# Altium footprint library PCB Modules.PcbLib: 23 footprints (part 1 of 2) (continued)
## PCBM_CERN_FEASTMP_V3_KIT [mm] "Full Kit of Radiation and Magnetic Field Tolerant 10W DC/DC Converter Module" (continued)
  text "1" at -14.247,3.196 h1
3D body "CERN_FEASTMP_V3_KIT_Part2.stp": height -1.6, standoff -4.4, extent -2.8,-3.175 2.778,3.176
3D body "CERN_FEASTMP_V3_KIT_Part1.stp": height 17.3, standoff -6.1, extent -21.57,-10.5 16,10.5

## PCBM_CERN_VTRX V2.1 (MM) [mm] "Versatile Transceiver Module VTRX V2.1 Multi-Mode Configuration (MM)"
height 10.24
pads (2):
  round 4.2 hole 3: 1(-25.74,0) 2(-12.74,0)
Top Overlay:
  circle w0.2: c-20.46,5.525 r0.4
  circle w0.2: c-20.46,-5.525 r0.4
  circle w0.2: c-20.46,-0.725 r0.4
  circle w0.2: c-20.46,0.725 r0.4
  lines w0.2: -46.5,-5.935 ccw(c-46.5,-5.535) -46.1,-5.535 ; -46.5,-0.465 cw(c-46.5,-0.865) -46.1,-0.865 -46.1,-5.539 ; -46.5,0.465 ccw(c-46.5,0.865) -46.1,0.852 -46.1,5.535 ccw(c-46.5,5.535) -46.5,5.935 ; -43.74,-5.435 -44.6,-5.435 -44.6,-5.935 -52.1,-5.935 -52.1,-0.465 -44.6,-0.465 -44.6,-0.965 -43.74,-0.965 ; -43.74,0.965 -44.6,0.965 -44.6,0.465 -52.1,0.465 -52.1,5.935 -44.6,5.935 -44.6,5.435 -43.74,5.435 ; -41,-0.925 -35.015,-0.925 ; -41,0.925 -35.015,0.925 ; -36.681,-5.45 cw(c-37.48,-5.42) -37.48,-6.22 -40.2,-6.22 cw(c-40.2,-5.42) -41,-5.42 -41,-4.525 -43.74,-4.525 -43.74,-7.25 -10.74,-7.25 -10.74,-6.05 ; -36.681,5.45 ccw(c-37.48,5.42) -37.48,6.22 -40.2,6.22 ccw(c-40.2,5.42) -41,5.42 -41,4.525 -43.74,4.525 -43.74,7.25 -10.74,7.25 -10.74,6.05 ; -35.38,-7.25 -35.38,-5.4 -37.321,-5.4 -37.321,-1.065 -35.015,-1.065 -35.015,1.065 -37.321,1.065 -37.321,5.4 -35.38,5.4 -35.38,7.25 ; -35.38,7.125 -28.43,7.125 -28.43,-7.125 ; -28.43,-6.42 -21.222,-6.42 ccw(c-21.222,-4.92) -20.44,-6.2 -10.74,-6.2 ; -28.43,-6.17 -24.97,-6.17 -24.97,-2.273 ; -28.43,-1.065 -29.13,-1.065 -29.13,-5.2 cw(c-29.93,-5.2) -29.93,-4.4 -29.93,-1.065 -31.68,-1.065 -31.68,1.065 -29.93,1.065 -29.93,4.4 cw(c-29.93,5.2) -29.13,5.2 -29.13,1.065 -28.43,1.065 ; -28.43,-0.23 -28.129,-0.23 ; -28.43,0.23 -28.129,0.23 ; -28.43,6.17 -24.97,6.17 -24.97,2.273 ; -28.43,6.42 -21.222,6.42 cw(c-21.222,4.92) -20.44,6.2 -10.74,6.2 ; -24.97,-5.7 -24.04,-5.7 ; -24.97,5.7 -24.04,5.7 ; -24.04,-1.694 -24.04,-5.995 -23.84,-5.995 -23.84,-1.466 ; -24.04,1.694 -24.04,5.995 -23.84,5.995 -23.84,1.466 ; -23.84,-5.45 -23.47,-5.45 ; -23.84,5.45 -23.47,5.45 ; -19.22,-6.2 cw(c-18.96,-6.35) -18.96,-6.05 -17.5,-6.05 cw(c-17.5,-6.35) -17.24,-6.2 ; -19.22,6.2 ccw(c-18.96,6.35) -18.96,6.05 -17.5,6.05 ccw(c-17.5,6.35) -17.24,6.2 ; -15.16,-6.2 cw(c-14.9,-6.35) -14.9,-6.05 -5.7,-6.05 -5.7,-4.9 cw(c-5.4,-4.9) -5.4,-4.6 -5.05,-4.6 ; -15.16,6.2 ccw(c-14.9,6.35) -14.9,6.05 -5.7,6.05 -5.7,4.9 ccw(c-5.4,4.9) -5.4,4.6 -5.05,4.6 ; -45.9,-4.35 -38.672,-4.35 -38.694,-2.05 -45.9,-2.05 -45.9,-4.35 ; -45.9,2.05 -38.672,2.05 -38.672,4.35 -45.9,4.35 -45.9,2.05 ; -43.74,-1.875 -41,-1.875 -41,-0.89 cw(c-40.6,-0.89) -40.6,-0.49 -38.894,-0.49 -38.894,0.49 -40.6,0.49 cw(c-40.6,0.89) -41,0.89 -41,1.875 -43.74,1.875 -43.74,-1.875 ; -23.47,-5.525 -20.96,-5.525 cw(c-20.46,-5.525) -19.96,-5.525 -18.17,-5.525 -18.17,-0.725 -19.96,-0.725 cw(c-20.46,-0.725) -20.96,-0.725 -23.47,-0.725 -23.47,-5.525 ; -23.47,0.725 -20.96,0.725 cw(c-20.46,0.725) -19.96,0.725 -18.17,0.725 -18.17,5.525 -19.96,5.525 cw(c-20.46,5.525) -20.96,5.525 -23.47,5.525 -23.47,0.725
Mechanical 8:
  lines w0.1: -26.24,0 -25.74,0 ; -25.74,-0.5 -25.74,0 ; -25.74,0.5 -25.74,0 ; -25.24,0 -25.74,0 ; -13.24,0 -12.74,0 ; -12.74,-0.5 -12.74,0 ; -12.74,0.5 -12.74,0 ; -12.24,0 -12.74,0 ; -0.5,0 0,0 ; 0,-0.5 0,0 ; 0,0.5 0,0 ; 0.5,0 0,0
Mechanical 14:
  drawing of 183 lines, arcs and shapes, not listed
3D body "PCBM_CERN_VTRX V2.1 (MM)_Part1.stp": height 7.9, standoff 1.3, extent -34.78,-6.85 1.8,6.85
3D body "PCBM_CERN_VTRX V2.1 (MM)_Part2.stp": height 10, standoff -1, extent -43.74,-7.25 -10.74,7.25
3D body "PCBM_CERN_VTRX V2.1 (MM)_Part3.stp": height 1.1, standoff -2.7, extent -27.639,-1.899 -10.841,1.899
3D body "PCBM_CERN_VTRX V2.1 (MM)_Part4.stp": height 11.71, standoff 1.87, extent -52.1,-5.935 -30.6,5.935

## PCBM_CERN_VTRX V2.1 (SM) [mm] "Versatile Transceiver Module VTRX V2.1 Single-Mode Configuration (SM)"
height 10.24
pads (2):
  round 4.2 hole 3: 1(-27.28,0) 2(-16.78,0)
Top Overlay:
  drawing of 706 lines, arcs and shapes, not listed
Mechanical 8:
  lines w0.1: -27.78,0 -27.28,0 ; -27.28,-0.5 -27.28,0 ; -27.28,0.5 -27.28,0 ; -26.78,0 -27.28,0 ; -17.28,0 -16.78,0 ; -16.78,-0.5 -16.78,0 ; -16.78,0.5 -16.78,0 ; -16.28,0 -16.78,0 ; -0.5,0 0,0 ; 0,-0.5 0,0 ; 0,0.5 0,0 ; 0.5,0 0,0
Mechanical 14:
  drawing of 760 lines, arcs and shapes, not listed
3D body "PCBM_CERN_VTRX V2.1 (SM)_Part3.stp": height 11.74, standoff 1.89, extent -56.14,-5.935 -34.64,5.935
3D body "PCBM_CERN_VTRX V2.1 (SM)_Part2.stp": height 1.1, standoff -2.7, extent -29.179,-1.899 -14.88,1.9
3D body "PCBM_CERN_VTRX V2.1 (SM)_Part1.stp": height 10.03, standoff -0.97, extent -47.78,-7.25 1.8,7.25

## PCBM_CERN_VTRx-V1.0 [mm] "Versatile Transmitter Module"
height 9.88
Top Overlay:
  drawing of 158 lines, arcs and shapes, not listed
Mechanical 8:
  lines w0.1: -0.5,0 0,0 ; 0,-0.5 0,0 ; 0,0.5 0,0 ; 0.5,0 0,0
Mechanical 14:
  drawing of 159 lines, arcs and shapes, not listed
3D body "PCBM_CERN_VTRx-V1.0.stp": height 11.74, standoff 0, extent -56.05,-7.225 0,7.225

## PCBM_CERN_VTRx-V2.0 [mm] "Versatile Transmitter Module"
height 10.24
pads (2):
  round 4.2 hole 3: 1(-27.54,0) 2(-14.54,0)
Top Overlay:
  circle w0.2: c-22.26,0.725 r0.4
  circle w0.2: c-22.26,-0.725 r0.4
  circle w0.2: c-22.26,-5.525 r0.4
  circle w0.2: c-22.26,5.525 r0.4
  lines w0.2: -48.3,-5.935 ccw(c-48.3,-5.535) -47.9,-5.535 ; -48.3,-0.465 cw(c-48.3,-0.865) -47.9,-0.865 -47.9,-5.539 ; -48.3,0.465 ccw(c-48.3,0.865) -47.9,0.852 -47.9,5.535 ccw(c-48.3,5.535) -48.3,5.935 ; -45.54,-5.435 -46.4,-5.435 -46.4,-5.935 -53.9,-5.935 -53.9,-0.465 -46.4,-0.465 -46.4,-0.965 -45.54,-0.965 ; -45.54,0.965 -46.4,0.965 -46.4,0.465 -53.9,0.465 -53.9,5.935 -46.4,5.935 -46.4,5.435 -45.54,5.435 ; -42.8,-0.925 -36.815,-0.925 ; -42.8,0.925 -36.815,0.925 ; -38.481,-5.45 cw(c-39.28,-5.42) -39.28,-6.22 -42,-6.22 cw(c-42,-5.42) -42.8,-5.42 -42.8,-4.525 -45.54,-4.525 -45.54,-7.25 -12.54,-7.25 -12.54,-6.05 ; -38.481,5.45 ccw(c-39.28,5.42) -39.28,6.22 -42,6.22 ccw(c-42,5.42) -42.8,5.42 -42.8,4.525 -45.54,4.525 -45.54,7.25 -12.54,7.25 -12.54,6.05 ; -37.18,-7.25 -37.18,-5.4 -39.121,-5.4 -39.121,-1.065 -36.815,-1.065 -36.815,1.065 -39.121,1.065 -39.121,5.4 -37.18,5.4 -37.18,7.25 ; -37.18,7.125 -30.23,7.125 -30.23,-7.125 ; -30.23,-6.42 -23.022,-6.42 ccw(c-23.022,-4.92) -22.24,-6.2 -12.54,-6.2 ; -30.23,-6.17 -26.77,-6.17 -26.77,-2.273 ; -30.23,-1.065 -30.93,-1.065 -30.93,-5.2 cw(c-31.73,-5.2) -31.73,-4.4 -31.73,-1.065 -33.48,-1.065 -33.48,1.065 -31.73,1.065 -31.73,4.4 cw(c-31.73,5.2) -30.93,5.2 -30.93,1.065 -30.23,1.065 ; -30.23,-0.23 -29.929,-0.23 ; -30.23,0.23 -29.929,0.23 ; -30.23,6.17 -26.77,6.17 -26.77,2.273 ; -30.23,6.42 -23.022,6.42 cw(c-23.022,4.92) -22.24,6.2 -12.54,6.2 ; -26.77,-5.7 -25.84,-5.7 ; -26.77,5.7 -25.84,5.7 ; -25.84,-1.694 -25.84,-5.995 -25.64,-5.995 -25.64,-1.466 ; -25.84,1.694 -25.84,5.995 -25.64,5.995 -25.64,1.466 ; -25.64,-5.45 -25.27,-5.45 ; -25.64,5.45 -25.27,5.45 ; -21.02,-6.2 cw(c-20.76,-6.35) -20.76,-6.05 -19.3,-6.05 cw(c-19.3,-6.35) -19.04,-6.2 ; -21.02,6.2 ccw(c-20.76,6.35) -20.76,6.05 -19.3,6.05 ccw(c-19.3,6.35) -19.04,6.2 ; -16.96,-6.2 cw(c-16.7,-6.35) -16.7,-6.05 -7.5,-6.05 -7.5,-4.9 cw(c-7.2,-4.9) -7.2,-4.6 -6.85,-4.6 ; -16.96,6.2 ccw(c-16.7,6.35) -16.7,6.05 -7.5,6.05 -7.5,4.9 ccw(c-7.2,4.9) -7.2,4.6 -6.85,4.6 ; -47.7,-4.35 -47.7,-2.05 -40.494,-2.05 -40.472,-4.35 -47.7,-4.35 ; -47.7,2.05 -47.7,4.35 -40.472,4.35 -40.472,2.05 -47.7,2.05 ; -45.54,-1.875 -45.54,1.875 -42.8,1.875 -42.8,0.89 ccw(c-42.4,0.89) -42.4,0.49 -40.694,0.49 -40.694,-0.49 -42.4,-0.49 ccw(c-42.4,-0.89) -42.8,-0.89 -42.8,-1.875 -45.54,-1.875 ; -25.27,-5.525 -25.27,-0.725 -22.76,-0.725 ccw(c-22.26,-0.725) -21.76,-0.725 -19.97,-0.725 -19.97,-5.525 -21.76,-5.525 ccw(c-22.26,-5.525) -22.76,-5.525 -25.27,-5.525 ; -25.27,0.725 -25.27,5.525 -22.76,5.525 ccw(c-22.26,5.525) -21.76,5.525 -19.97,5.525 -19.97,0.725 -21.76,0.725 ccw(c-22.26,0.725) -22.76,0.725 -25.27,0.725
Mechanical 8:
  lines w0.1: -28.04,0 -27.54,0 ; -27.54,-0.5 -27.54,0 ; -27.54,0.5 -27.54,0 ; -27.04,0 -27.54,0 ; -15.04,0 -14.54,0 ; -14.54,-0.5 -14.54,0 ; -14.54,0.5 -14.54,0 ; -14.04,0 -14.54,0 ; -0.5,0 0,0 ; 0,-0.5 0,0 ; 0,0.5 0,0 ; 0.5,0 0,0
Mechanical 14:
  drawing of 183 lines, arcs and shapes, not listed
3D body "PCBM_CERN_VTRx-V2.0_Part1.stp": height 11.71, standoff -1, extent -53.9,-7.25 0,7.25
3D body "PCBM_CERN_VTRx-V2.0_Part2.stp": height 1.1, standoff -2.7, extent -29.439,-1.899 -12.64,1.9

## PCBM_CERN_VTTx V2.1 [mm] "Versatile Twin Transmitter Module"
height 10.24
pads (2):
  round 4.2 hole 3: 1(-25.74,0) 2(-12.74,0)
Top Overlay:
  circle w0.2: c-20.46,5.525 r0.4
  circle w0.2: c-20.46,-5.525 r0.4
  circle w0.2: c-20.46,-0.725 r0.4
  circle w0.2: c-20.46,0.725 r0.4
  lines w0.2: -46.5,-5.935 ccw(c-46.5,-5.535) -46.1,-5.535 ; -46.5,-0.465 cw(c-46.5,-0.865) -46.1,-0.865 -46.1,-5.539 ; -46.5,0.465 ccw(c-46.5,0.865) -46.1,0.853 -46.1,5.535 ccw(c-46.5,5.535) -46.5,5.935 ; -43.74,-5.435 -44.6,-5.435 -44.6,-5.935 -52.1,-5.935 -52.1,-0.465 -44.6,-0.465 -44.6,-0.965 -43.74,-0.965 ; -43.74,0.965 -44.6,0.965 -44.6,0.465 -52.1,0.465 -52.1,5.935 -44.6,5.935 -44.6,5.435 -43.74,5.435 ; -41,-0.925 -35.015,-0.925 ; -41,0.925 -35.015,0.925 ; -36.681,-5.45 cw(c-37.48,-5.42) -37.48,-6.22 -40.2,-6.22 cw(c-40.2,-5.42) -41,-5.42 -41,-4.525 -43.74,-4.525 -43.74,-7.25 -10.74,-7.25 -10.74,-6.05 ; -36.681,5.45 ccw(c-37.48,5.42) -37.48,6.22 -40.2,6.22 ccw(c-40.2,5.42) -41,5.42 -41,4.525 -43.74,4.525 -43.74,7.25 -10.74,7.25 -10.74,6.05 ; -35.38,-7.25 -35.38,-5.4 -37.321,-5.4 -37.321,-1.065 -35.015,-1.065 -35.015,1.065 -37.321,1.065 -37.321,5.4 -35.38,5.4 -35.38,7.25 ; -35.38,7.125 -28.43,7.125 -28.43,-7.125 ; -28.43,-6.42 -21.222,-6.42 ccw(c-21.222,-4.92) -20.44,-6.2 -10.74,-6.2 ; -28.43,-6.17 -24.97,-6.17 -24.97,-2.273 ; -28.43,-1.065 -29.13,-1.065 -29.13,-5.2 cw(c-29.93,-5.2) -29.93,-4.4 -29.93,-1.065 -31.68,-1.065 -31.68,1.065 -29.93,1.065 -29.93,4.4 cw(c-29.93,5.2) -29.13,5.2 -29.13,1.065 -28.43,1.065 ; -28.43,-0.23 -28.129,-0.23 ; -28.43,0.23 -28.129,0.23 ; -28.43,6.17 -24.97,6.17 -24.97,2.273 ; -28.43,6.42 -21.222,6.42 cw(c-21.222,4.92) -20.44,6.2 -10.74,6.2 ; -24.97,-5.7 -24.04,-5.7 ; -24.97,5.7 -24.04,5.7 ; -24.04,-1.694 -24.04,-5.995 -23.84,-5.995 -23.84,-1.466 ; -24.04,1.694 -24.04,5.995 -23.84,5.995 -23.84,1.466 ; -23.84,-5.45 -23.47,-5.45 ; -23.84,5.45 -23.47,5.45 ; -19.22,-6.2 cw(c-18.96,-6.35) -18.96,-6.05 -17.5,-6.05 cw(c-17.5,-6.35) -17.24,-6.2 ; -19.22,6.2 ccw(c-18.96,6.35) -18.96,6.05 -17.5,6.05 ccw(c-17.5,6.35) -17.24,6.2 ; -15.16,-6.2 cw(c-14.9,-6.35) -14.9,-6.05 -5.7,-6.05 -5.7,-4.9 cw(c-5.4,-4.9) -5.4,-4.6 -5.05,-4.6 ; -15.16,6.2 ccw(c-14.9,6.35) -14.9,6.05 -5.7,6.05 -5.7,4.9 ccw(c-5.4,4.9) -5.4,4.6 -5.05,4.6 ; -45.9,-4.35 -38.672,-4.35 -38.694,-2.05 -45.9,-2.05 -45.9,-4.35 ; -45.9,2.05 -38.672,2.05 -38.672,4.35 -45.9,4.35 -45.9,2.05 ; -43.74,-1.875 -41,-1.875 -41,-0.89 cw(c-40.6,-0.89) -40.6,-0.49 -38.894,-0.49 -38.894,0.49 -40.6,0.49 cw(c-40.6,0.89) -41,0.89 -41,1.875 -43.74,1.875 -43.74,-1.875 ; -23.47,-5.525 -20.96,-5.525 cw(c-20.46,-5.525) -19.96,-5.525 -18.17,-5.525 -18.17,-0.725 -19.96,-0.725 cw(c-20.46,-0.725) -20.96,-0.725 -23.47,-0.725 -23.47,-5.525 ; -23.47,0.725 -20.96,0.725 cw(c-20.46,0.725) -19.96,0.725 -18.17,0.725 -18.17,5.525 -19.96,5.525 cw(c-20.46,5.525) -20.96,5.525 -23.47,5.525 -23.47,0.725
Mechanical 8:
  lines w0.1: -26.24,0 -25.74,0 ; -25.74,-0.5 -25.74,0 ; -25.74,0.5 -25.74,0 ; -25.24,0 -25.74,0 ; -13.24,0 -12.74,0 ; -12.74,-0.5 -12.74,0 ; -12.74,0.5 -12.74,0 ; -12.24,0 -12.74,0 ; -0.5,0 0,0 ; 0,-0.5 0,0 ; 0,0.5 0,0 ; 0.5,0 0,0
Mechanical 14:
  drawing of 183 lines, arcs and shapes, not listed
3D body "PCBM_CERN_VTTX V2_Part1.stp": height 7.9, standoff 1.3, extent -34.78,-6.85 1.8,6.85
3D body "PCBM_CERN_VTTX V2_Part2.stp": height 10, standoff -1, extent -43.74,-7.25 -10.74,7.25
3D body "PCBM_CERN_VTTX V2_Part3.stp": height 1.1, standoff -2.7, extent -27.639,-1.899 -10.84,1.9
3D body "PCBM_CERN_VTTX V2_Part4.stp": height 11.71, standoff 1.87, extent -52.1,-5.935 -30.6,5.935

## PCBM_CERN_VTTx-V1.0 [mm] "Versatile Twin Transmitter Module"
height 9.88
Top Overlay:
  drawing of 158 lines, arcs and shapes, not listed
Mechanical 8:
  lines w0.1: -0.5,0 0,0 ; 0,-0.5 0,0 ; 0,0.5 0,0 ; 0.5,0 0,0
Mechanical 14:
  drawing of 159 lines, arcs and shapes, not listed
3D body "PCBM_CERN_VTTx-V1.0.stp": height 11.74, standoff 0, extent -56.05,-7.225 0,7.225

## PCBM_CERN_VTTx-V2.0 [mm] "Versatile Twin Transmitter Module"
height 10.24
pads (2):
  round 4.2 hole 3: 1(-25.74,0) 2(-12.74,0)
Top Overlay:
  circle w0.2: c-20.46,0.725 r0.4
  circle w0.2: c-20.46,-0.725 r0.4
  circle w0.2: c-20.46,-5.525 r0.4
  circle w0.2: c-20.46,5.525 r0.4
  lines w0.2: -46.5,-5.935 ccw(c-46.5,-5.535) -46.1,-5.535 ; -46.5,-0.465 cw(c-46.5,-0.865) -46.1,-0.865 -46.1,-5.539 ; -46.5,0.465 ccw(c-46.5,0.865) -46.1,0.853 -46.1,5.535 ccw(c-46.5,5.535) -46.5,5.935 ; -43.74,-5.435 -44.6,-5.435 -44.6,-5.935 -52.1,-5.935 -52.1,-0.465 -44.6,-0.465 -44.6,-0.965 -43.74,-0.965 ; -43.74,0.965 -44.6,0.965 -44.6,0.465 -52.1,0.465 -52.1,5.935 -44.6,5.935 -44.6,5.435 -43.74,5.435 ; -41,-0.925 -35.015,-0.925 ; -41,0.925 -35.015,0.925 ; -36.681,-5.45 cw(c-37.48,-5.42) -37.48,-6.22 -40.2,-6.22 cw(c-40.2,-5.42) -41,-5.42 -41,-4.525 -43.74,-4.525 -43.74,-7.25 -10.74,-7.25 -10.74,-6.05 ; -36.681,5.45 ccw(c-37.48,5.42) -37.48,6.22 -40.2,6.22 ccw(c-40.2,5.42) -41,5.42 -41,4.525 -43.74,4.525 -43.74,7.25 -10.74,7.25 -10.74,6.05 ; -35.38,-7.25 -35.38,-5.4 -37.321,-5.4 -37.321,-1.065 -35.015,-1.065 -35.015,1.065 -37.321,1.065 -37.321,5.4 -35.38,5.4 -35.38,7.25 ; -35.38,7.125 -28.43,7.125 -28.43,-7.125 ; -28.43,-6.42 -21.222,-6.42 ccw(c-21.222,-4.92) -20.44,-6.2 -10.74,-6.2 ; -28.43,-6.17 -24.97,-6.17 -24.97,-2.273 ; -28.43,-1.065 -29.13,-1.065 -29.13,-5.2 cw(c-29.93,-5.2) -29.93,-4.4 -29.93,-1.065 -31.68,-1.065 -31.68,1.065 -29.93,1.065 -29.93,4.4 cw(c-29.93,5.2) -29.13,5.2 -29.13,1.065 -28.43,1.065 ; -28.43,-0.23 -28.129,-0.23 ; -28.43,0.23 -28.129,0.23 ; -28.43,6.17 -24.97,6.17 -24.97,2.273 ; -28.43,6.42 -21.222,6.42 cw(c-21.222,4.92) -20.44,6.2 -10.74,6.2 ; -24.97,-5.7 -24.04,-5.7 ; -24.97,5.7 -24.04,5.7 ; -24.04,-1.694 -24.04,-5.995 -23.84,-5.995 -23.84,-1.466 ; -24.04,1.694 -24.04,5.995 -23.84,5.995 -23.84,1.466 ; -23.84,-5.45 -23.47,-5.45 ; -23.84,5.45 -23.47,5.45 ; -19.22,-6.2 cw(c-18.96,-6.35) -18.96,-6.05 -17.5,-6.05 cw(c-17.5,-6.35) -17.24,-6.2 ; -19.22,6.2 ccw(c-18.96,6.35) -18.96,6.05 -17.5,6.05 ccw(c-17.5,6.35) -17.24,6.2 ; -15.16,-6.2 cw(c-14.9,-6.35) -14.9,-6.05 -5.7,-6.05 -5.7,-4.9 cw(c-5.4,-4.9) -5.4,-4.6 -5.05,-4.6 ; -15.16,6.2 ccw(c-14.9,6.35) -14.9,6.05 -5.7,6.05 -5.7,4.9 ccw(c-5.4,4.9) -5.4,4.6 -5.05,4.6 ; -45.9,-4.35 -45.9,-2.05 -38.694,-2.05 -38.672,-4.35 -45.9,-4.35 ; -45.9,2.05 -45.9,4.35 -38.672,4.35 -38.672,2.05 -45.9,2.05 ; -43.74,-1.875 -43.74,1.875 -41,1.875 -41,0.89 ccw(c-40.6,0.89) -40.6,0.49 -38.894,0.49 -38.894,-0.49 -40.6,-0.49 ccw(c-40.6,-0.89) -41,-0.89 -41,-1.875 -43.74,-1.875 ; -23.47,-5.525 -23.47,-0.725 -20.96,-0.725 ccw(c-20.46,-0.725) -19.96,-0.725 -18.17,-0.725 -18.17,-5.525 -19.96,-5.525 ccw(c-20.46,-5.525) -20.96,-5.525 -23.47,-5.525 ; -23.47,0.725 -23.47,5.525 -20.96,5.525 ccw(c-20.46,5.525) -19.96,5.525 -18.17,5.525 -18.17,0.725 -19.96,0.725 ccw(c-20.46,0.725) -20.96,0.725 -23.47,0.725
Mechanical 8:
  lines w0.1: -26.24,0 -25.74,0 ; -25.74,-0.5 -25.74,0 ; -25.74,0.5 -25.74,0 ; -25.24,0 -25.74,0 ; -13.24,0 -12.74,0 ; -12.74,-0.5 -12.74,0 ; -12.74,0.5 -12.74,0 ; -12.24,0 -12.74,0 ; -0.5,0 0,0 ; 0,-0.5 0,0 ; 0,0.5 0,0 ; 0.5,0 0,0
Mechanical 14:
  drawing of 183 lines, arcs and shapes, not listed
3D body "PCBM_CERN_VTTx-V2.0_Part2.stp": height 1.1, standoff -2.7, extent -29.439,-1.899 -12.641,1.899
3D body "PCBM_CERN_VTTx-V2.0_Part1.stp": height 11.71, standoff -1, extent -53.9,-7.25 0,7.25

## PCBM_CIBIR 1V2 [mm] "Controls Interlocks Beam Interface Receiver (CIBIR) 1V2 Printed Circuit Board Module"
height 12.9
pads (2):
  round 6 hole 2.8: H1(-6.35,-15.24) H2(-6.35,15.24)
Top Overlay:
  circle w0.2: c3.042,-11.469 r0.4
  lines w0.1: -48.285,-12.12 -58.355,-12.12 ; -48.285,-3.12 -58.355,-3.12 ; -47.055,-12.97 -47.055,-13.47 -46.555,-13.47 ; -47.055,-2.27 -47.055,-1.77 -46.555,-1.77 ; -34.255,-13.47 -33.755,-13.47 -33.755,-12.97 ; -8.482,-17.78 -13.085,-17.78 -13.085,-16.48 -48.285,-16.48 -48.285,16.48 -13.085,16.48 -13.085,17.78 -8.482,17.78 ; -4.268,-17.78 3.785,-17.78 3.785,17.78 -4.268,17.78 ; -2.54,-12.2 -2.54,-12.7 -2.04,-12.7 ; -2.54,12.2 -2.54,12.7 ; -2.5,12.7 -2,12.7 ; 2.04,-12.7 2.54,-12.7 2.54,-12.2 ; 2.04,12.7 2.54,12.7 2.54,12.2 ; -58.355,-12.12 -58.355,-3.12 ; -58.355,-12.12 -58.755,-11.72 -58.755,-3.52 -58.355,-3.12 ; -33.755,-1.77 -33.755,-2.27 -33.755,-1.77 ; -33.755,-1.77 -34.255,-1.77 -33.755,-1.77
Mechanical 8:
  lines w0.1: -6.875,-15.24 -6.375,-15.24 ; -6.875,15.24 -6.375,15.24 ; -6.375,-15.74 -6.375,-15.24 ; -6.375,-14.74 -6.375,-15.24 ; -6.375,14.74 -6.375,15.24 ; -6.375,15.74 -6.375,15.24 ; -5.875,-15.24 -6.375,-15.24 ; -5.875,15.24 -6.375,15.24 ; -1.77,-11.43 -1.27,-11.43 ; -1.77,-8.89 -1.27,-8.89 ; -1.77,-6.35 -1.27,-6.35 ; -1.77,-3.81 -1.27,-3.81 ; -1.77,-1.27 -1.27,-1.27 ; -1.77,1.27 -1.27,1.27 ; -1.77,3.81 -1.27,3.81 ; -1.77,6.35 -1.27,6.35 ; -1.77,8.89 -1.27,8.89 ; -1.77,11.43 -1.27,11.43 ; -1.27,-11.93 -1.27,-11.43 ; -1.27,-10.93 -1.27,-11.43 ; -1.27,-9.39 -1.27,-8.89 ; -1.27,-8.39 -1.27,-8.89 ; -1.27,-6.85 -1.27,-6.35 ; -1.27,-5.85 -1.27,-6.35 ; -1.27,-4.31 -1.27,-3.81 ; -1.27,-3.31 -1.27,-3.81 ; -1.27,-1.77 -1.27,-1.27 ; -1.27,-0.77 -1.27,-1.27 ; -1.27,0.77 -1.27,1.27 ; -1.27,1.77 -1.27,1.27 ; -1.27,3.31 -1.27,3.81 ; -1.27,4.31 -1.27,3.81 ; -1.27,5.85 -1.27,6.35 ; -1.27,6.85 -1.27,6.35 ; -1.27,8.39 -1.27,8.89 ; -1.27,9.39 -1.27,8.89 ; -1.27,10.93 -1.27,11.43 ; -1.27,11.93 -1.27,11.43 ; -0.77,-11.43 -1.27,-11.43 ; -0.77,-8.89 -1.27,-8.89 ; -0.77,-6.35 -1.27,-6.35 ; -0.77,-3.81 -1.27,-3.81 ; -0.77,-1.27 -1.27,-1.27 ; -0.77,1.27 -1.27,1.27 ; -0.77,3.81 -1.27,3.81 ; -0.77,6.35 -1.27,6.35 ; -0.77,8.89 -1.27,8.89 ; -0.77,11.43 -1.27,11.43 ; -0.5,0 0,0 ; 0,-0.5 0,0 ; 0,0.5 0,0 ; 0.5,0 0,0 ; 0.77,-11.43 1.27,-11.43 ; 0.77,-8.89 1.27,-8.89 ; 0.77,-6.35 1.27,-6.35 ; 0.77,-3.81 1.27,-3.81 ; 0.77,-1.27 1.27,-1.27 ; 0.77,1.27 1.27,1.27 ; 0.77,3.81 1.27,3.81 ; 0.77,6.35 1.27,6.35 ; 0.77,8.89 1.27,8.89 ; 1.27,-11.93 1.27,-11.43 ; 1.27,-10.93 1.27,-11.43 ; 1.27,-9.39 1.27,-8.89 ; 1.27,-8.39 1.27,-8.89 ; 1.27,-6.85 1.27,-6.35 ; 1.27,-5.85 1.27,-6.35 ; 1.27,-4.31 1.27,-3.81 ; 1.27,-3.31 1.27,-3.81 ; 1.27,-1.77 1.27,-1.27 ; 1.27,-0.77 1.27,-1.27 ; 1.27,0.77 1.27,1.27 ; 1.27,1.77 1.27,1.27 ; 1.27,3.31 1.27,3.81 ; 1.27,4.31 1.27,3.81 ; 1.27,5.85 1.27,6.35 ; 1.27,6.85 1.27,6.35 ; 1.27,8.39 1.27,8.89 ; 1.27,9.39 1.27,8.89 ; 1.77,-11.43 1.27,-11.43 ; 1.77,-8.89 1.27,-8.89 ; 1.77,-6.35 1.27,-6.35 ; 1.77,-3.81 1.27,-3.81 ; 1.77,-1.27 1.27,-1.27 ; 1.77,1.27 1.27,1.27 ; 1.77,3.81 1.27,3.81 ; 1.77,6.35 1.27,6.35 ; 1.77,8.89 1.27,8.89 ; 1.27,11.43 1.27,10.93 1.27,11.43 ; 1.27,11.43 1.77,11.43 1.27,11.43 ; 1.27,11.43 1.27,11.93 1.27,11.43 ; 1.27,11.43 0.77,11.43 1.27,11.43
Mechanical 14:
  circle w0.1: c-6.375,-15.24 r1.35
  circle w0.1: c-6.375,15.24 r1.35
  circle w0.1: c-6.35,15.24 r1.35
  circle w0.1: c3.042,-11.469 r0.4
  lines w0.1: -48.285,-12.12 -58.355,-12.12 ; -48.285,-3.12 -58.355,-3.12 ; -47.055,-12.97 -47.055,-13.47 -46.555,-13.47 ; -47.055,-2.27 -47.055,-1.77 -46.555,-1.77 ; -34.255,-13.47 -33.755,-13.47 -33.755,-12.97 ; -9.375,-15.24 ccw(c-6.375,-15.24) -8.973,-16.74 ; -9.375,15.24 ccw(c-6.375,15.24) -8.973,13.74 ; -9.35,-15.24 ccw(c-6.35,-15.24) -8.948,-16.74 ; -9.35,15.24 ccw(c-6.35,15.24) -8.948,13.74 ; -8.973,-13.74 cw(c-6.375,-15.24) -7.875,-12.642 ; -8.973,16.74 cw(c-6.375,15.24) -7.971,17.78 cw(c-6.375,15.24) -4.779,17.78 ; -8.948,-13.74 cw(c-6.35,-15.24) -7.85,-12.642 ; -7.971,-17.78 ccw(c-6.375,-15.24) -4.779,-17.78 ccw(c-6.375,-15.24) -3.777,-16.74 ; -7.875,12.642 ccw(c-6.375,15.24) -6.375,12.24 ; -7.85,12.642 ccw(c-6.35,15.24) -6.35,12.24 ; -6.375,-12.24 cw(c-6.375,-15.24) -4.875,-12.642 ; -6.35,-12.24 cw(c-6.35,-15.24) -4.85,-12.642 ; -4.875,12.642 ccw(c-6.375,15.24) -3.777,13.74 ; -4.85,12.642 ccw(c-6.35,15.24) -3.752,13.74 ; -3.777,-13.74 cw(c-6.375,-15.24) -3.375,-15.24 ; -3.777,16.74 cw(c-6.375,15.24) -3.375,15.24 ; -2.54,-12.2 -2.54,-12.7 -2.04,-12.7 ; -2.54,12.2 -2.54,12.7 ; -2.5,12.7 -2,12.7 ; 2.04,-12.7 2.54,-12.7 2.54,-12.2 ; 2.04,12.7 2.54,12.7 2.54,12.2 ; -58.355,-12.12 -58.355,-3.12 ; -58.355,-12.12 -58.755,-11.72 -58.755,-3.52 -58.355,-3.12 ; -33.755,-1.77 -33.755,-2.27 -33.755,-1.77 ; -33.755,-1.77 -34.255,-1.77 -33.755,-1.77 ; -48.285,-16.48 -13.085,-16.48 -13.085,-17.78 3.785,-17.78 3.785,17.78 -13.085,17.78 -13.085,16.48 -48.285,16.48 -48.285,-16.48
3D body "PCBM_CIBIR 1V2.stp": height 15.3, standoff -1.4, extent -58.755,-17.78 3.785,17.78

## PCBM_EDA-00278-V1 [mm] "\"Wideband Solid State Switch\" Printed Circuit Board Module"
height 16
pads (1):
  rect 56.89x56.89 smd: 1(0,0)
Top Overlay:
  lines w0.2: -31.817,15.243 -31.017,15.243 ; -31.817,16.543 -31.017,16.543 ; -29.617,14.943 -31.017,14.943 -31.017,16.843 -29.617,16.843 ; -25.917,-23.893 -25.917,-25.893 -23.917,-25.893 ; -25.917,23.893 -25.917,25.893 -23.917,25.893 ; -23.167,-26.893 -23.167,-29.809 cw(c-25.562,-39.731) -20.817,-30.693 ; -22.84,-29.893 -17.995,-29.893 ; -22.634,-29.887 ccw(c-22.517,-28.886) -21.867,-29.656 ; -21.867,-26.893 -21.867,-29.656 ; -20.817,-33.193 -20.817,-30.693 ; -20.017,-33.193 -20.017,-30.693 ; -18.967,-26.893 -18.967,-29.656 ; -18.2,-29.887 cw(c-18.317,-28.886) -18.967,-29.656 ; -17.667,-26.893 -17.667,-29.809 ccw(c-15.273,-39.731) -20.017,-30.693 ; -13.667,26.893 -13.667,29.809 ccw(c-16.062,39.731) -11.317,30.693 ; -13.34,29.893 -8.495,29.893 ; -13.134,29.887 cw(c-13.017,28.886) -12.367,29.656 ; -12.367,26.893 -12.367,29.656 ; -11.317,33.193 -11.317,30.693 ; -10.517,33.193 -10.517,30.693 ; -9.467,26.893 -9.467,29.656 ; -8.7,29.887 ccw(c-8.817,28.886) -9.467,29.656 ; -8.167,26.893 -8.167,29.809 cw(c-5.773,39.731) -10.517,30.693 ; 23.917,-25.893 25.917,-25.893 25.917,-23.893 ; 23.917,25.893 25.917,25.893 25.917,23.893 ; 25.917,-21.483 30.203,-21.483 ; 25.917,-19.683 30.897,-19.683 ; 25.917,-4.983 30.075,-4.983 ; 25.917,-3.183 30.768,-3.183 ; 25.917,19.517 30.203,19.517 ; 25.917,21.317 30.897,21.317 ; 29.601,-23.047 31.236,-18.802 ; 29.601,-6.213 31.236,-1.968 ; 29.601,17.953 31.236,22.198 ; -28.817,14.293 -28.317,14.943 -28.317,16.843 -28.817,17.493 ; -28.817,14.293 -29.617,14.293 -29.617,17.493 -28.817,17.493 ; -28.817,14.293 -28.817,17.493 ; -21.867,-29.656 ccw(c-20.417,-25.352) -18.967,-29.656 ; -20.817,-30.693 -20.017,-30.693 ; -12.367,29.656 cw(c-10.917,25.352) -9.467,29.656 ; -11.317,30.693 -10.517,30.693 ; -32.617,14.943 -32.617,16.843 -31.817,16.843 -31.817,14.943 -32.617,14.943 ; -28.317,13.493 -28.317,18.293 -25.917,18.293 -25.917,13.493 -28.317,13.493 ; -23.617,-26.893 -17.217,-26.893 -17.217,-25.893 -23.617,-25.893 -23.617,-26.893 ; -20.967,-33.693 -19.867,-33.693 -19.867,-33.193 -20.967,-33.193 -20.967,-33.693 ; -14.117,25.893 -7.717,25.893 -7.717,26.893 -14.117,26.893 -14.117,25.893 ; -11.467,33.193 -11.467,33.693 -10.367,33.693 -10.367,33.193 -11.467,33.193
Mechanical 8:
  lines w0.1: -25.917,24.991 25.014,24.991 25.014,-24.991 -25.014,-24.991 -25.014,24.088 -17.874,24.088 -17.874,24.991 ; -0.9,-0.025 0.1,-0.025 ; 0.1,-1.025 0.1,-0.025 ; 0.1,0.975 0.1,-0.025 ; 1.1,-0.025 0.1,-0.025 ; 0,0 0,1 0,0 ; 0,0 1,0 0,0 ; 0,0 -1,0 0,0 ; 0,0 0,-1 0,0 ; -25.917,-25.893 -25.917,25.893 25.917,25.893 25.917,-25.893 -25.917,-25.893
Mechanical 14:
  drawing of 1230 lines, arcs and shapes, not listed
3D body "PCBM_EDA-00278-V1.stp": height 15.5, standoff 0, extent -32.917,-33.693 27.337,33.694

## PCBM_EDA-02878-V2-0 [mm] "TPS40303 DC/DC Converter Module"
height 5.5
pads (5):
  round 2.1 hole 1.4: 2(-7.938,1.27) 3(-7.938,-6.35) 4(4.763,-6.35) 7(7.938,-1.27) 10(7.938,6.35)
Top Overlay:
  lines w0.2: -9.462,-7.874 -9.462,7.874 9.462,7.874 9.462,-7.874 -9.462,-7.874
  text "VI" at -6.2,0.8 h1
  text "INH" at 4.3,5.8 h1
  text "VO" at 1.4,-6.9 h1
  text "GND" at -6.2,-6.9 h1
  text "VADJ" at 3,-1.8 h1
Mechanical 8:
  lines w0.05: -8.438,-6.35 -7.938,-6.35 -7.938,-6.85 ; -8.438,1.27 -7.938,1.27 -7.938,0.77 ; -0.5,0 0,0 ; 0,-0.5 0,0 ; 0,0.5 0,0 ; 0.5,0 0,0 ; 4.263,-6.35 4.763,-6.35 4.763,-6.85 ; 7.438,-1.27 7.938,-1.27 7.938,-1.77 ; 7.438,6.35 7.938,6.35 7.938,5.85
Mechanical 14:
  circle w0.1: c-7.938,-6.35 r0.51
  circle w0.1: c4.763,-6.35 r0.51
  circle w0.1: c7.938,-1.27 r0.51
  circle w0.1: c7.938,6.35 r0.51
  circle w0.1: c-7.938,1.27 r0.51
  lines w0.1: -9.462,-7.874 -9.462,7.874 9.462,7.874 9.462,-7.874 -9.462,-7.874 ; -9.014,-3.609 -9.014,-0.759 -7.314,-0.759 -7.314,-3.609 -9.014,-3.609 ; -8.711,3.658 ccw(c-8.611,3.658) -8.611,3.558 -7.011,3.558 ccw(c-7.011,3.658) -6.911,3.658 -6.911,6.858 ccw(c-7.011,6.858) -7.011,6.958 -8.611,6.958 ccw(c-8.611,6.858) -8.711,6.858 -8.711,3.658 ; -7.088,-6.736 ccw(c-6.588,-6.736) -6.588,-7.236 3.413,-7.236 ccw(c3.413,-6.736) 3.913,-6.736 3.913,1.614 ccw(c3.413,1.614) 3.413,2.114 -6.588,2.114 ccw(c-6.588,1.614) -7.088,1.614 -7.088,-6.736 ; -6.171,3.658 ccw(c-6.071,3.658) -6.071,3.558 -4.471,3.558 ccw(c-4.471,3.658) -4.371,3.658 -4.371,6.858 ccw(c-4.471,6.858) -4.471,6.958 -6.071,6.958 ccw(c-6.071,6.858) -6.171,6.858 -6.171,3.658 ; -3.631,3.658 ccw(c-3.531,3.658) -3.531,3.558 -1.931,3.558 ccw(c-1.931,3.658) -1.831,3.658 -1.831,6.858 ccw(c-1.931,6.858) -1.931,6.958 -3.531,6.958 ccw(c-3.531,6.858) -3.631,6.858 -3.631,3.658 ; -0.964,3.658 ccw(c-0.864,3.658) -0.864,3.558 0.736,3.558 ccw(c0.736,3.658) 0.836,3.658 0.836,6.858 ccw(c0.736,6.858) 0.736,6.958 -0.864,6.958 ccw(c-0.864,6.858) -0.964,6.858 -0.964,3.658 ; 1.703,3.658 ccw(c1.803,3.658) 1.803,3.558 3.403,3.558 ccw(c3.403,3.658) 3.503,3.658 3.503,6.858 ccw(c3.403,6.858) 3.403,6.958 1.803,6.958 ccw(c1.803,6.858) 1.703,6.858 1.703,3.658 ; 4.777,5.975 ccw(c4.877,5.975) 4.877,5.875 6.427,5.875 ccw(c6.427,5.975) 6.527,5.975 6.527,6.725 ccw(c6.427,6.725) 6.427,6.825 4.877,6.825 ccw(c4.877,6.725) 4.777,6.725 4.777,5.975 ; 6.384,-6.426 ccw(c6.484,-6.426) 6.484,-6.526 8.984,-6.526 ccw(c8.984,-6.426) 9.084,-6.426 9.084,-3.226 ccw(c8.984,-3.226) 8.984,-3.126 6.484,-3.126 ccw(c6.484,-3.226) 6.384,-3.226 6.384,-6.426
3D body "PCBM_EDA-02878-V2-0.stp": height 8.1, standoff -3.29, extent -9.461,-7.874 9.462,7.874